# Altium footprint library OpenRec.PcbLib: 90 footprints (part 2 of 6)
Each footprint in its own frame and in the unit in brackets; x right, y up, seen from the top. Pads: shape width x height; smd on the part's side, far side on the other; paste and mask are expansions set on the pad; w line width, h text height; cw(c..) or ccw(c..) is an arc to the next point about the centre after c.
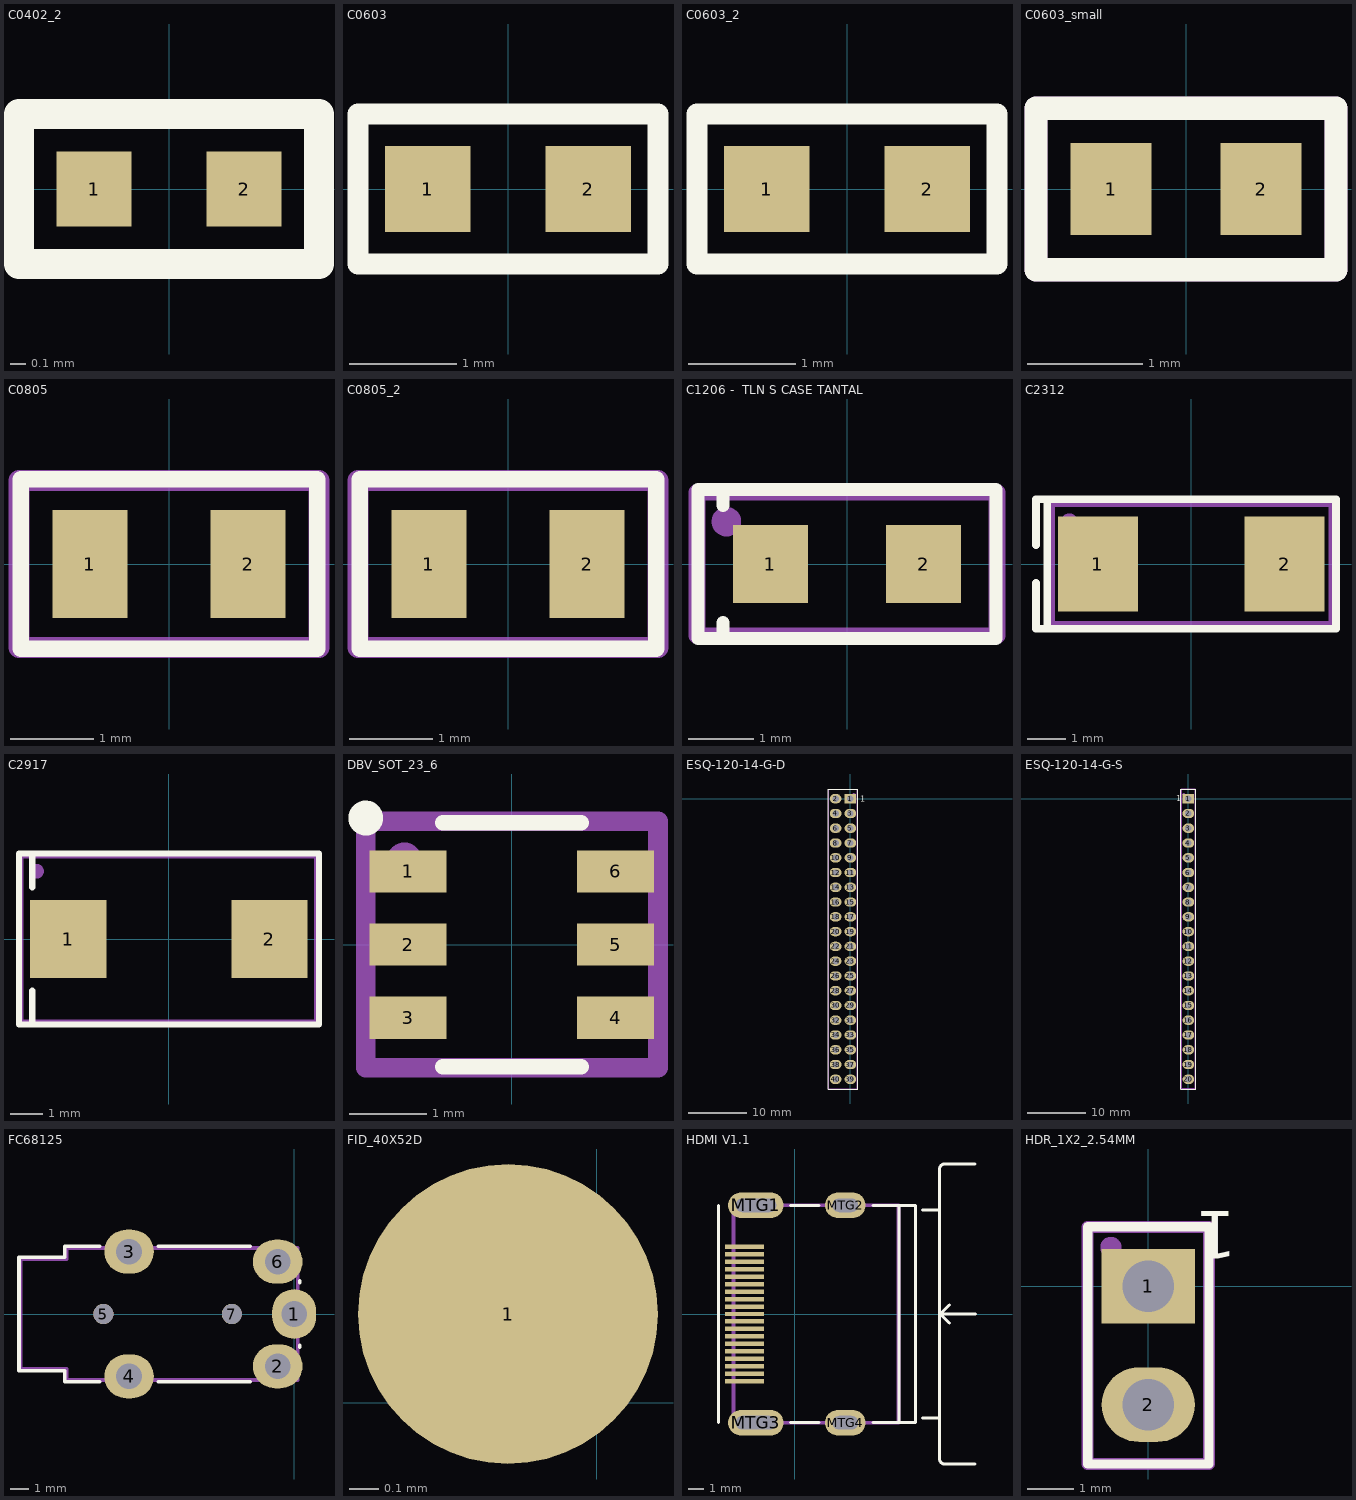
[diagram p1: the footprints below, top view; thin cyan lines are the x and y axes]

## C0402_2 [mm]
pads (2):
  rect 0.5x0.5 smd: 1(-0.5,0) 2(0.5,0)
Top Overlay:
  lines w0.2: -1,-0.5 1,-0.5 1,0.5 -1,0.5 -1,-0.5
Assembly Drawing:
  lines w0.15: -1,-0.5 1,-0.5 1,0.5 -1,0.5 -1,-0.5
  text ".Designator" at 0.7,0.2 h0.4
3D body "CAPC1005X56N EIA 0402.step": height 0.56, standoff 0, extent -0.5,-0.25 0.5,0.25

## C0603 [mm]
pads (2):
  rect 0.8x0.8 smd: 1(-0.75,0) 2(0.75,0)
Top Overlay:
  lines w0.2: -1.4,-0.7 -1.4,0.7 1.4,0.7 1.4,-0.7 -1.4,-0.7
Assembly Drawing:
  lines w0.15: -1.4,-0.7 1.4,-0.7 1.4,0.7 -1.4,0.7 -1.4,-0.7
  text ".Designator" at 1.1,0.3 h0.6
3D body "C0603.step": height 0.79, standoff 0, extent -0.8,-0.425 0.8,0.435
3D body "C0603.step": height 0.95, standoff 0.15, extent -0.8,-0.425 0.8,0.435

## C0603_2 [mm]
pads (2):
  rect 0.8x0.8 smd: 1(-0.75,0) 2(0.75,0)
Top Overlay:
  lines w0.2: -1.4,-0.7 -1.4,0.7 1.4,0.7 1.4,-0.7 -1.4,-0.7
Assembly Drawing:
  lines w0.15: -1.4,-0.7 1.4,-0.7 1.4,0.7 -1.4,0.7 -1.4,-0.7
  text ".Designator" at 1.1,0.3 h0.6
3D body "C0603.step": height 0.79, standoff 0, extent -0.8,-0.425 0.8,0.435
3D body "C0603.step": height 0.95, standoff 0.15, extent -0.8,-0.425 0.8,0.435

## C0603_small [mm]
pads (2):
  rect 0.7x0.8 smd: 1(-0.65,0) 2(0.65,0)
Top Overlay:
  lines w0.2: -1.3,-0.7 -1.3,0.7 1.3,0.7 1.3,-0.7 -1.3,-0.7
Assembly Drawing:
  lines w0.2: -1.3,-0.7 1.3,-0.7 1.3,0.7 -1.3,0.7 -1.3,-0.7
  text ".Designator" at -0.8,-0.3 h0.6
3D body "C0603.step": height 0.79, standoff 0, extent -0.8,-0.425 0.8,0.435
3D body "C0603.step": height 0.95, standoff 0.15, extent -0.8,-0.425 0.8,0.435

## C0805 [mm]
pads (2):
  rect 0.9x1.3 smd: 1(-0.95,0) 2(0.95,0)
Top Overlay:
  lines w0.2: -1.778,-1.016 -1.778,1.016 1.778,1.016 1.778,-1.016 -1.778,-1.016
Assembly Drawing:
  lines w0.254: -1.8,-1 -1.8,1 1.8,1 1.8,-1 -1.8,-1
  text ".Designator" at -1,-0.3 h0.6
3D body "CAPC2012X95N EIA 0805.step": height 1.5, standoff 0.55, extent -1,-0.6 1,0.6
3D body "CAPC2012X95N EIA 0805.step": height 0.95, standoff 0, extent -1,-0.6 1,0.6

## C0805_2 [mm]
pads (2):
  rect 0.9x1.3 smd: 1(-0.95,0) 2(0.95,0)
Top Overlay:
  lines w0.2: -1.778,-1.016 -1.778,1.016 1.778,1.016 1.778,-1.016 -1.778,-1.016
Assembly Drawing:
  lines w0.254: -1.8,-1 -1.8,1 1.8,1 1.8,-1 -1.8,-1
  text ".Designator" at 1.1,0.3 h0.6
3D body "CAPC2012X95N EIA 0805.step": height 1.5, standoff 0.55, extent -1,-0.6 1,0.6
3D body "CAPC2012X95N EIA 0805.step": height 0.95, standoff 0, extent -1,-0.6 1,0.6

## C1206 -  TLN S CASE TANTAL [mm]
pads (2):
  rect 1.15x1.2 smd: 1(-1.175,0) 2(1.175,0)
Top Overlay:
  lines w0.2: -1.9,-1.143 -1.9,-0.9 ; -1.9,0.9 -1.9,1.143 ; -2.286,-1.143 2.286,-1.143 2.286,1.143 -2.286,1.143 -2.286,-1.143
Assembly Drawing:
  circle w0.254: c-1.85,0.65 r0.1
  lines w0.254: -2.3,-1.1 2.3,-1.1 2.3,1.1 -2.3,1.1 -2.3,-1.1
  text ".Designator" at 1.9,0.4 h1
3D body: height 1.2, standoff 0, extent -1.6,-0.8 1.6,0.8
3D body: height 1.21, standoff 1.2, extent -1.6,-0.8 -0.9,0.8

## C2312 [mm]
pads (2):
  rect 2.1x2.5 smd mask+0.09: 1(-2.45,0) 2(2.45,0)
Top Overlay:
  lines w0.2: -4.075,-0.5 -4.075,-1.7 3.8,-1.7 3.8,1.7 -4.075,1.7 -4.075,0.5 ; -3.775,-1.7 -3.775,1.7
Assembly Drawing:
  circle w0.254: c-3.2,1.1 r0.1
  lines w0.2: -3.675,-1.6 -3.675,1.6 3.7,1.6 3.7,-1.6 -3.675,-1.6
  text ".Designator" at -2.2,-0.7 h1.52
3D body "Tantalum Capacitor Case C.STEP": height 2.68, standoff -0.01, extent -3.093,-1.605 3.093,1.6
3D body: height 2.7, standoff 2.6, extent -2.4,-1.5 2.9,1.5

## C2917 [mm]
pads (2):
  rect 2.37x2.43 smd: 1(-3.12,0) 2(3.12,0)
Top Overlay:
  lines w0.2: -4.24,-2.65 -4.24,-1.6 ; -4.24,1.6 -4.24,2.65 ; -4.645,-2.65 4.655,-2.65 4.655,2.65 -4.645,2.65 -4.645,-2.65
Assembly Drawing:
  circle w0.254: c-4.1,2.1 r0.1
  lines w0.2: -4.6,-2.6 -4.6,2.6 4.6,2.6 4.6,-2.6 -4.6,-2.6
  text ".Designator" at 2.8,0.8 h1.52
3D body "CAP_TANT_7343-31.step": height 3.1, standoff 0, extent -3.795,-2.3 3.805,2.3

## DBV_SOT_23_6 [mm]
pads (6):
  rect 1x0.55 smd: 1(-1.35,0.95) 2(-1.35,0) 3(-1.35,-0.95) 4(1.35,-0.95) 5(1.35,0) 6(1.35,0.95)
Top Overlay:
  circle w0.254: c-1.9,1.644 r0.1
  lines w0.2: -0.9,-1.59 0.9,-1.59 ; -0.9,1.585 0.9,1.585
Assembly Drawing:
  circle w0.254: c-1.4,1.1 r0.1
  lines w0.254: -1.9,-1.6 1.9,-1.6 1.9,1.6 -1.9,1.6 -1.9,-1.6
  text ".Designator" at -1.5,0.6 h0.6
3D body: height 1.2, standoff 0, extent 0.889,0.699 1.587,1.206
3D body: height 1.2, standoff 0, extent 0.889,-0.254 1.587,0.254
3D body: height 1.2, standoff 0, extent 0.889,-1.206 1.587,-0.699
3D body: height 1.2, standoff 0, extent -1.587,-1.206 -0.889,-0.699
3D body: height 1.2, standoff 0, extent -1.587,-0.254 -0.889,0.254
3D body: height 1.2, standoff 0, extent -1.587,0.699 -0.889,1.206
3D body: height 1.45, standoff 0, extent -0.889,-1.587 0.889,1.587

## ESQ-120-14-G-D [mm]
pads (40):
  rect 2x1.6 hole 1.1: 1(0,0)
  oval 2x1.6 hole 1.1: 2(-2.54,0) 3(0,-2.54) 4(-2.54,-2.54) 5(0,-5.08) 6(-2.54,-5.08) 7(0,-7.62) 8(-2.54,-7.62) 9(0,-10.16) 10(-2.54,-10.16) 11(0,-12.7) 12(-2.54,-12.7) 13(0,-15.24) 14(-2.54,-15.24) 15(0,-17.78) 16(-2.54,-17.78) 17(0,-20.32) 18(-2.54,-20.32) 19(0,-22.86) 20(-2.54,-22.86) 21(0,-25.4) 22(-2.54,-25.4) 23(0,-27.94) 24(-2.54,-27.94) 25(0,-30.48) 26(-2.54,-30.48) 27(0,-33.02) 28(-2.54,-33.02) 29(0,-35.56) 30(-2.54,-35.56) 31(0,-38.1) 32(-2.54,-38.1) 33(0,-40.64) 34(-2.54,-40.64) 35(0,-43.18) 36(-2.54,-43.18) 37(0,-45.72) 38(-2.54,-45.72) 39(0,-48.26) 40(-2.54,-48.26)
Top Overlay:
  lines w0.2: -3.84,-49.93 -3.84,1.67 1.3,1.67 1.3,-49.93 -3.84,-49.93
  text "1" at 1.65,-0.5 h1.02
Bottom Overlay:
  lines w0.2: -3.84,-49.93 1.3,-49.93 1.3,1.67 -3.84,1.67 -3.84,-49.93
  text "1" at 2,-0.41 h1.02
Assembly Drawing:
  circle w0.5: c0.6,0.6 r0.1
  lines w0.2: -3.74,-49.85 1.2,-49.85 1.2,1.59 -3.74,1.59 -3.74,-49.85
  text ".Designator" at -0.6,-25.6 h1.52
3D body "ESQ-120-14-G-D.stp": height 12.11, standoff -11.13, extent -3.81,-49.784 1.27,1.524

## ESQ-120-14-G-S [mm]
pads (20):
  rect 2x1.6 hole 1.1: 1(0,0)
  oval 2x1.6 hole 1.1: 2(0,-2.54) 3(0,-5.08) 4(0,-7.62) 5(0,-10.16) 6(0,-12.7) 7(0,-15.24) 8(0,-17.78) 9(0,-20.32) 10(0,-22.86) 11(0,-25.4) 12(0,-27.94) 13(0,-30.48) 14(0,-33.02) 15(0,-35.56) 16(0,-38.1) 17(0,-40.64) 18(0,-43.18) 19(0,-45.72) 20(0,-48.26)
Top Overlay:
  lines w0.2: -1.3,-49.93 1.3,-49.93 1.3,1.67 -1.3,1.67 -1.3,-49.93
  text "1" at -2.12,-0.4 h1.02
Bottom Overlay:
  lines w0.2: -1.3,-49.93 -1.3,1.67 1.3,1.67 1.3,-49.93 -1.3,-49.93
  text "1" at -0.82,2.2 h1.02
Assembly Drawing:
  circle w0.254: c-0.8,0.79 r0.1
  lines w0.254: -1.2,-49.85 1.2,-49.85 1.2,1.59 -1.2,1.59 -1.2,-49.85
  text ".Designator" at 0.78,-25.4 h1.52
3D body "ESQ-120-14-G-S.stp": height 11.11, standoff -12.13, extent -1.274,-49.784 1.266,1.524

## FC68125 [mm]
pads (7):
  oval 2.4x2.7 hole 1.4: 1(0,0)
  oval 2.7x2.4 hole 1.4: 2(-0.9,-2.85) 3(-9,3.4) 4(-9,-3.4) 6(-0.9,2.85)
  round 1.1 hole 1.1 unplated: 5(-10.4,0) 7(-3.4,0)
Top Overlay:
  lines w0.2: -10.6,-3.7 -12.5,-3.7 -12.5,-3.1 -15,-3.1 -15,3.1 -12.5,3.1 -12.5,3.7 -10.6,3.7 ; -7.4,-3.7 -2.4,-3.7 ; -7.4,3.7 -2.4,3.7 ; 0.3,-1.8 0.3,-1.7 ; 0.3,1.7 0.3,1.8
Assembly Drawing:
  lines w0.2: -14.9,-3 -14.9,3 -12.4,3 -12.4,3.6 0.2,3.6 0.2,-3.6 -12.4,-3.6 -12.4,-3 -14.9,-3
  text ".Designator" at -6.8,2.2 h1.6
3D body: height 6, standoff 0, extent -12.4,-3.6 0.2,3.6
3D body: height 5.98, standoff 0, extent -14.876,-2.988 -12.376,3

## FID_40X52D [mm]
pads (1):
  round 1.016 smd paste-1.016 mask+0.15: 1(-0.3,0.3)

## HDMI V1.1 [mm]
pads (23):
  rect 2.6x0.3 smd mask+0.025: 1(-3.36,4.5) 2(-3.36,4) 3(-3.36,3.5) 4(-3.36,3) 5(-3.36,2.5) 6(-3.36,2) 7(-3.36,1.5) 8(-3.36,1) 9(-3.36,0.5) 10(-3.36,0) 11(-3.36,-0.5) 12(-3.36,-1) 13(-3.36,-1.5) 14(-3.36,-2) 15(-3.36,-2.5) 16(-3.36,-3) 17(-3.36,-3.5) 18(-3.36,-4) 19(-3.36,-4.5)
  oval 3.7x1.7 hole 0.9 slot 2.7 at 0 deg: MTG1(-2.6,7.25) MTG3(-2.6,-7.25)
  oval 2.7x1.7 hole 0.9 slot 1.7 at 0 deg: MTG2(3.36,7.25) MTG4(3.36,-7.25)
Top Overlay:
  lines w0.2: -5.1,-7.25 -5.1,7.25 ; -0.3,-7.25 1.6,-7.25 ; -0.3,7.25 1.6,7.25 ; 5.2,-7.25 8.05,-7.25 8.05,7.25 5.2,7.25 ; 6.95,-7.2 6.95,7.25 ; 8.5,-6.95 9.65,-6.95 ; 8.5,6.95 9.65,6.95 ; 9.95,10 12,10 ; 10,10 ccw(c9.975,9.675) 9.65,9.7 9.65,-9.7 ccw(c9.975,-9.675) 10,-10 12,-10 ; 10.3,-0.6 9.7,0 ; 10.3,0.6 9.7,0 ; 12.05,0 9.7,0
3D Drawing:
  text "NOTE: Bottom plastic may" at -0.7,30.4 h0.5
  text "go over the board edge" at -0.7,29.5 h0.5
Assembly Drawing:
  lines w0.254: -4.1,-7.25 -4.1,7.25 6.9,7.25 6.9,-7.25 -4.1,-7.25
  text ".Designator" at 0.2,1.4 h1.52
3D body "471510001.stp": height 6.28, standoff -2.1, extent -4.2,-7.5 7.95,7.5

## HDR_1X2_2.54MM [mm]
pads (2):
  rect 2x1.6 hole 1.1: 1(0,0)
  oval 2x1.6 hole 1.1: 2(0,-2.54)
Top Overlay:
  lines w0.2: -1.3,-3.81 -1.3,1.27 1.3,1.27 1.3,-3.81 -1.3,-3.81
  text "1" at 1.9,1.6 h1.02
Assembly Drawing:
  circle w0.254: c-0.8,0.83 r0.1
  lines w0.254: -1.3,-3.81 1.3,-3.81 1.3,1.27 -1.3,1.27 -1.3,-3.81
  text ".Designator" at -0.5,0.1 h1
3D body "77311-118-02lf.stp": height 8.4, standoff -3.1, extent -1.205,-3.62 1.205,1.06